# Altium footprint library Footprints.PcbLib: 67 footprints (part 4 of 5)
Each footprint in its own frame and in the unit in brackets; x right, y up, seen from the top. Pads: shape width x height; smd on the part's side, far side on the other; paste and mask are expansions set on the pad; w line width, h text height; cw(c..) or ccw(c..) is an arc to the next point about the centre after c.
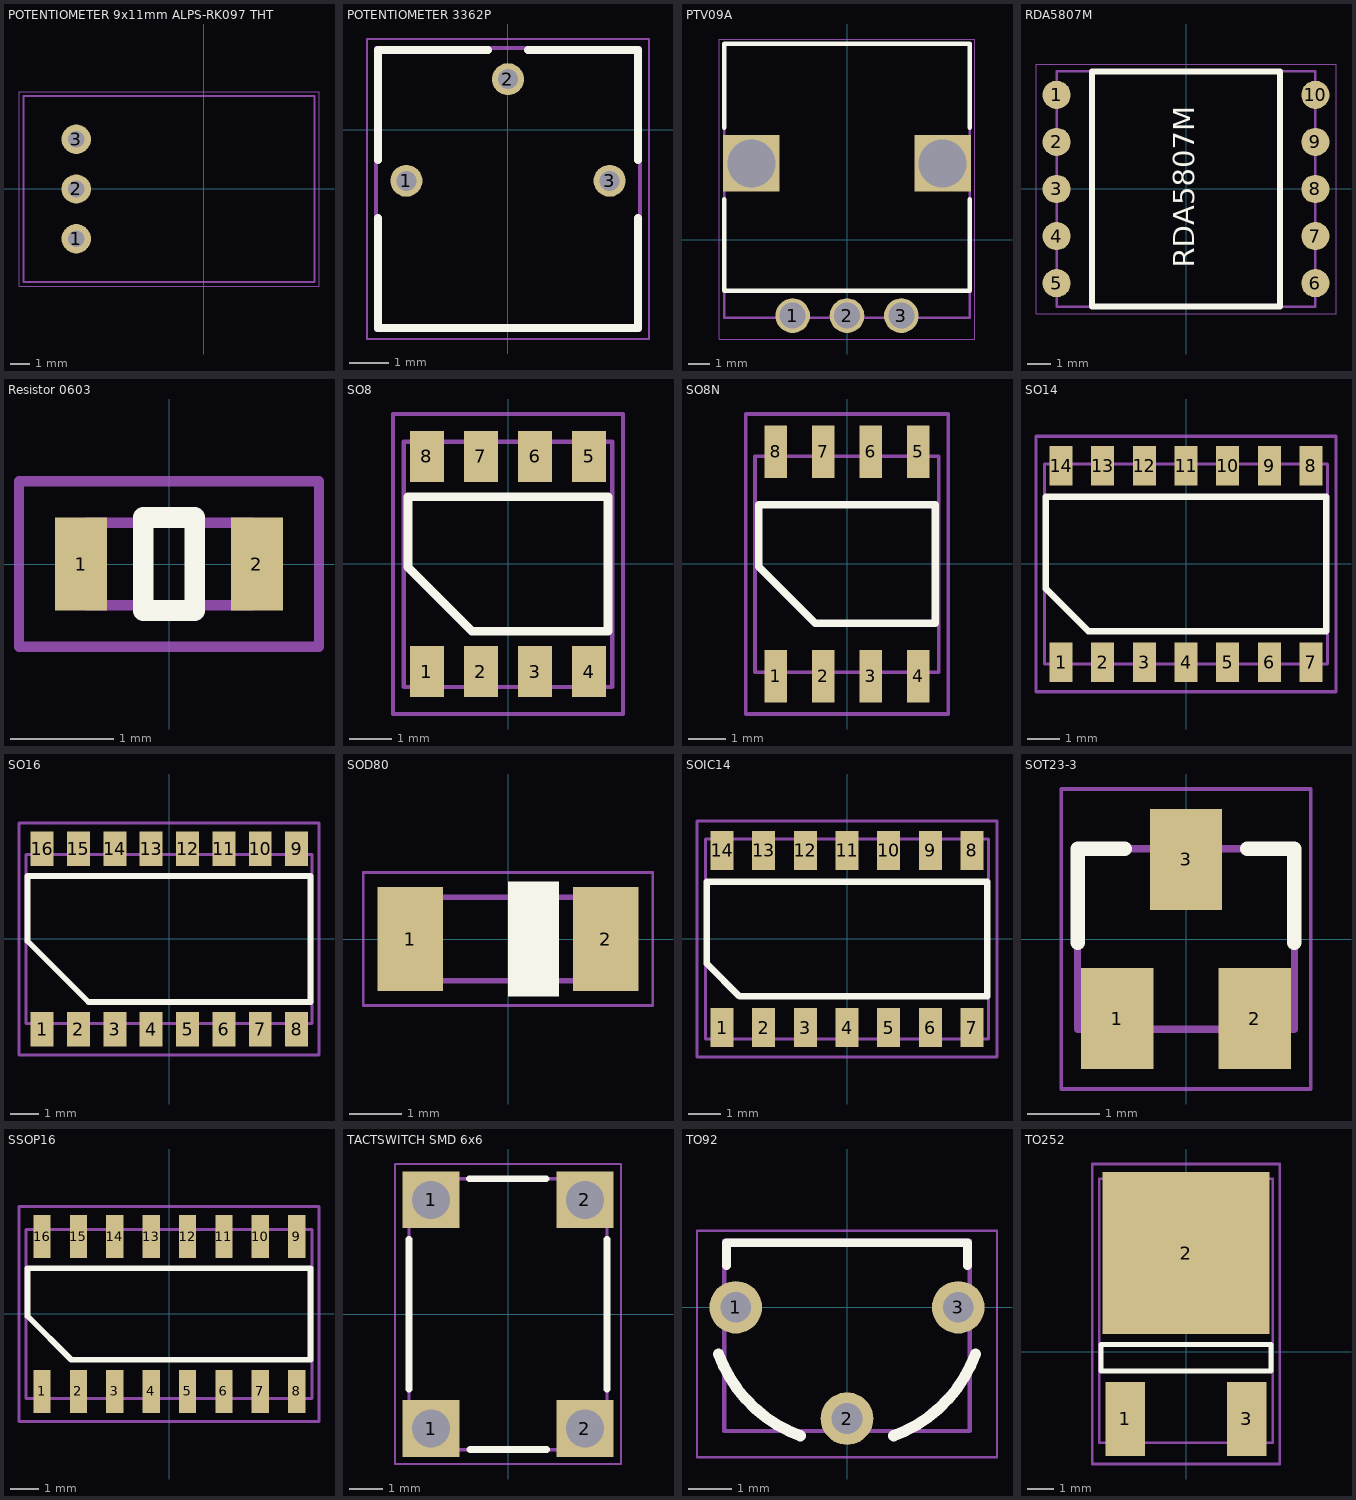
[diagram p3: the footprints below, top view; thin cyan lines are the x and y axes]

## POTENTIOMETER 9x11mm ALPS-RK097 THT [mm]
pads (3):
  round 1.5 hole 0.85: 1(-6.5,-2.54) 2(-6.5,0) 3(-6.5,2.54)
Placement:
  lines w0.1: -9.2,-4.75 5.675,-4.75 5.675,4.75 -9.2,4.75 -9.2,-4.75
  text "'.Designator'" at -8.125,-0.875 h2.4
Keep-Out:
  lines w0.05: -9.425,-4.975 -9.425,4.975 5.9,4.975 5.9,-4.975 -9.425,-4.975
3D body "pot.step": height 46.92, standoff 19.87, extent -9.207,-4.745 5.669,4.755

## POTENTIOMETER 3362P [mm]
pads (3):
  round 0.8 hole 0.5: 1(-2.54,-1.27) 2(0,1.27) 3(2.54,-1.27)
Top Overlay:
  lines w0.2: -3.25,-2.2 -3.25,-4.95 3.25,-4.95 3.25,-2.2 ; -3.25,-0.75 -3.25,2 -0.5,2 ; 0.5,2 3.25,2 3.25,-0.75
Placement:
  lines w0.1: -3.3,-5 -3.3,2.05 3.3,2.05 3.3,-5 -3.3,-5
  text "'.Designator'" at -2.5,-2 h1.8
Keep-Out:
  lines w0.05: -3.525,-5.225 3.525,-5.225 3.525,2.275 -3.525,2.275 -3.525,-5.225
3D body "User Library-Bourns 3362P.step": height 4.7, standoff -5.47, extent -3.3,-5.004 3.3,2.05

## PTV09A [mm]
pads (5):
  round 1.6 hole 1.2: 1(-2.5,-3.5) 2(0,-3.5) 3(2.5,-3.5)
  rect 2.6x2.6 hole 2.2 square: ""(-4.4,3.5) ""(4.4,3.5)
Top Overlay:
  lines w0.2: -5.65,1.85 -5.65,-2.35 5.65,-2.35 5.65,1.85 ; -5.65,5.15 -5.65,9 5.65,9 5.65,5.15
Placement:
  lines w0.1: -5.65,-3.6 5.65,-3.6 5.65,9 -5.65,9 -5.65,-3.6
  text "'.Designator'" at -4.5,6.35 h1.2
Keep-Out:
  lines w0.05: -5.875,-4.575 -5.875,9.225 5.875,9.225 5.875,-4.575 -5.875,-4.575
3D body "User Library-PTV09A-4.STEP": height 32.14, standoff -3.13, extent -5.65,-3.6 5.65,9

## RDA5807M [mm]
pads (10):
  round 1.2 smd: 1(-5.5,4) 2(-5.5,2) 3(-5.5,0) 4(-5.5,-2) 5(-5.5,-4) 6(5.5,-4) 7(5.5,-2) 8(5.5,0) 9(5.5,2) 10(5.5,4)
Top Overlay:
  lines w0.254: -4,-5 -4,5 4,5 4,-5 -4,-5
  text "RDA5807M" at 0.35,-3.35 h0.9
Placement:
  lines w0.1: -5.5,-5 5.5,-5 5.5,5 -5.5,5 -5.5,-5
  text "'.Designator'" at -3.2,-0.55 h1.2
Keep-Out:
  lines w0.05: -6.375,-5.3 6.375,-5.3 6.375,5.3 -6.375,5.3 -6.375,-5.3
3D body: height 1, standoff 0, extent -5.5,-5 5.5,5
3D body: height 2, standoff 1, extent -2,0 2,4
3D body: height 2, standoff 1, extent -3.5,-3 3,-2

## Resistor 0603 [mm]
pads (2):
  rect 0.5x0.9 smd: 1(-0.85,0) 2(0.85,0)
Top Overlay:
  lines w0.2: -0.25,-0.45 0.25,-0.45 0.25,0.45 -0.25,0.45 -0.25,-0.45
Placement:
  lines w0.1: -0.8,-0.4 -0.8,0.4 0.8,0.4 0.8,-0.4 -0.8,-0.4
  text "'.Designator'" at -0.225,-0.025 h0.3
Keep-Out:
  lines w0.1: -1.45,-0.8 1.45,-0.8 1.45,0.8 -0.675,0.8 -1.45,0.8 -1.45,-0.8
3D body "User Library-SMD RESISTOR-1.step": height 0.43, standoff -0.03, extent -0.8,-0.4 0.8,0.4

## SO8 [mm]
pads (8):
  rect 0.8x1.2 smd: 1(-1.905,-2.53) 2(-0.635,-2.53) 3(0.635,-2.53) 4(1.905,-2.53) 5(1.905,2.53) 6(0.635,2.53) 7(-0.635,2.53) 8(-1.905,2.53)
Top Overlay:
  lines w0.2: -2.35,-0.075 -0.85,-1.575 2.35,-1.575 2.35,1.575 -2.35,1.575 -2.35,-0.075
Placement:
  lines w0.1: -2.452,-2.89 -2.452,2.874 2.449,2.874 2.449,-2.89 -2.452,-2.89
  text "'.Designator'" at -1.8,0.6 h1.2
Keep-Out:
  lines w0.1: -2.7,-3.525 -2.7,3.525 2.7,3.525 2.7,-3.525 -2.7,-3.525
3D body "CircuitWorks-SO-8.step": height 1.45, standoff 0, extent -2.452,-2.889 2.45,2.889

## SO8N [mm]
pads (8):
  rect 0.6x1.4 smd: 1(-1.905,-3) 2(-0.635,-3) 3(0.635,-3) 4(1.905,-3) 5(1.905,3) 6(0.635,3) 7(-0.635,3) 8(-1.905,3)
Top Overlay:
  lines w0.2: -2.35,-0.075 -0.85,-1.575 2.35,-1.575 2.35,1.575 -2.35,1.575 -2.35,-0.075
Placement:
  lines w0.1: -2.452,-2.89 -2.452,2.874 2.449,2.874 2.449,-2.89 -2.452,-2.89
  text "'.Designator'" at -1.8,0.6 h1.2
Keep-Out:
  lines w0.1: -2.7,-4 -2.7,4 2.7,4 2.7,-4 -2.7,-4
3D body "CircuitWorks-SO-8.step": height 1.45, standoff 0, extent -2.452,-2.889 2.45,2.889

## SO14 [mm]
pads (14):
  rect 0.7x1.2 smd: 1(-3.81,-3) 2(-2.54,-3) 3(-1.27,-3) 4(0,-3) 5(1.27,-3) 6(2.54,-3) 7(3.81,-3) 8(3.81,3) 9(2.54,3) 10(1.27,3) 11(0,3) 12(-1.27,3) 13(-2.54,3) 14(-3.81,3)
Top Overlay:
  lines w0.2: -4.275,-0.75 -4.275,2.05 4.275,2.05 4.275,-2.05 -2.975,-2.05 -4.275,-0.75
Placement:
  lines w0.1: -4.318,-3.048 4.318,-3.048 4.318,3.048 -4.318,3.048 -4.318,-3.048
Keep-Out:
  lines w0.1: -4.575,-3.9 4.575,-3.9 4.575,3.9 -4.575,3.9 -4.575,-3.9
3D body "CircuitWorks-SO-14.step": height 1.75, standoff 0, extent -4.318,-3.048 4.318,3.048

## SO16 [mm]
pads (16):
  rect 0.8x1.2 smd: 1(-4.445,-3.15) 2(-3.175,-3.15) 3(-1.905,-3.15) 4(-0.635,-3.15) 5(0.635,-3.15) 6(1.905,-3.15) 7(3.175,-3.15) 8(4.445,-3.15) 9(4.445,3.15) 10(3.175,3.15) 11(1.905,3.15) 12(0.635,3.15) 13(-0.635,3.15) 14(-1.905,3.15) 15(-3.175,3.15) 16(-4.445,3.15)
Top Overlay:
  lines w0.2: -4.95,-0.075 -2.825,-2.2 4.925,-2.2 4.925,2.2 -4.95,2.2 -4.95,-0.075
Placement:
  lines w0.1: -5,-2.95 -5,2.95 4.975,2.95 4.975,-2.95 -5,-2.95
  text "'.Designator'" at -3.8,0.6 h1.2
Keep-Out:
  lines w0.1: -5.25,-4.05 -5.25,4.05 5.225,4.05 5.225,-4.05 -5.25,-4.05
3D body "CircuitWorks-SO-16.step": height 1.45, standoff 0, extent -4.982,-2.953 5,2.953

## SOD80 [mm]
pads (2):
  rect 1.25x2 smd: 1(-1.875,0) 2(1.875,0)
Top Overlay:
  rectangle: 0,-1.1 0.975,1.1
Placement:
  lines w0.1: -1.825,-0.8 1.875,-0.8 1.875,0.8 -1.825,0.8 -1.825,-0.8
  text "'.Designator'" at -1.475,-0.175 h0.6
Keep-Out:
  lines w0.05: -2.775,-1.275 2.775,-1.275 2.775,1.275 -1.25,1.275 -2.775,1.275 -2.775,-1.275
3D body "User Library-MiniMelf-2.step": height 1.58, standoff -0.02, extent -1.82,-0.8 1.88,0.8

## SOIC14 [mm]
pads (14):
  rect 0.7x1.2 smd: 1(-3.81,-2.7) 2(-2.54,-2.7) 3(-1.27,-2.7) 4(0,-2.7) 5(1.27,-2.7) 6(2.54,-2.7) 7(3.81,-2.7) 8(3.81,2.7) 9(2.54,2.7) 10(1.27,2.7) 11(0,2.7) 12(-1.27,2.7) 13(-2.54,2.7) 14(-3.81,2.7)
Top Overlay:
  lines w0.2: -4.275,-0.75 -4.275,1.75 4.275,1.75 4.275,-1.75 -3.275,-1.75 -4.275,-0.75
Placement:
  lines w0.1: -4.318,-3.048 4.318,-3.048 4.318,3.048 -4.318,3.048 -4.318,-3.048
Keep-Out:
  lines w0.1: -4.575,-3.6 4.575,-3.6 4.575,3.6 -4.575,3.6 -4.575,-3.6
3D body "CircuitWorks-SO-14.step": height 1.75, standoff 0, extent -4.318,-3.048 4.318,3.048

## SOT23-3 [mm]
pads (3):
  rect 1x1.4 smd: 1(-0.95,-1.1) 2(0.95,-1.1) 3(0,1.1)
Top Overlay:
  lines w0.2: -1.5,-0.05 -1.5,1.25 -0.85,1.25 ; 0.85,1.25 1.5,1.25 1.5,-0.05
Placement:
  lines w0.1: -1.5,-1.25 -1.5,1.25 1.5,1.25 1.5,-1.25 -1.5,-1.25
  text "'.Designator'" at -1.25,-0.075 h0.3
Keep-Out:
  lines w0.05: -1.725,-2.075 1.725,-2.075 1.725,2.075 -1.725,2.075 -1.725,-2.075
3D body "User Library-SOT95P240X110-3M[SOT23-3_TO-236AB].step": height 1.09, standoff 0, extent -1.5,-1.25 1.5,1.25

## SSOP16 [mm]
pads (16):
  rect 0.6x1.5 smd: 1(-4.445,-2.7) 2(-3.175,-2.7) 3(-1.905,-2.7) 4(-0.635,-2.7) 5(0.635,-2.7) 6(1.905,-2.7) 7(3.175,-2.7) 8(4.445,-2.7) 9(4.445,2.7) 10(3.175,2.7) 11(1.905,2.7) 12(0.635,2.7) 13(-0.635,2.7) 14(-1.905,2.7) 15(-3.175,2.7) 16(-4.445,2.7)
Top Overlay:
  lines w0.2: -4.95,-0.075 -4.95,1.6 4.925,1.6 4.925,-1.6 -3.425,-1.6 -4.95,-0.075
Placement:
  lines w0.1: -5,-2.95 4.975,-2.95 4.975,2.95 -5,2.95 -5,-2.95
  text "'.Designator'" at -3.8,0.6 h1.2
Keep-Out:
  lines w0.1: -5.25,-3.75 5.225,-3.75 5.225,3.75 -5.25,3.75 -5.25,-3.75
3D body "CircuitWorks-SO-16.step": height 1.45, standoff 0, extent -4.982,-2.953 5,2.953

## TACTSWITCH SMD 6x6 [mm]
pads (4):
  rect 1.725x1.725 hole 1.15: 1(-2.33,-3.466) 1(-2.33,3.466) 2(2.33,-3.466) 2(2.33,3.466)
Top Overlay:
  lines w0.2: -3,-2.275 -3,2.275 ; -1.175,4.1 1.15,4.1 ; -1.15,-4.1 1.175,-4.1 ; 3,-2.275 3,2.275
Placement:
  lines w0.1: -3,-4.106 -3,4.106 3,4.106 3,-4.106 -3,-4.106
  text "'.Designator'" at 0,0 h0.76
Keep-Out:
  lines w0.05: -3.425,-4.541 3.425,-4.541 3.425,4.55 -3.425,4.55 -3.425,-4.541
3D body "Mechanical tactswitch THT.step": height 9.5, standoff -3.5, extent -3,-4.106 3,4.106

## TO92 [mm]
pads (3):
  round 1.2 hole 0.7: 1(-2.54,0) 2(0,-2.54) 3(2.54,0)
Top Overlay:
  lines w0.2: -2.75,0.95 -2.75,1.475 2.75,1.475 2.75,0.95
  lines w0.254: -2.932,-1.067 ccw(c0,0) -1.067,-2.932 ; 1.067,-2.932 ccw(c0,0) 2.932,-1.067
Placement:
  lines w0.1: -2.8,-2.825 -2.8,1.525 2.8,1.525 2.8,-2.825 -2.8,-2.825
  text "'.Designator'" at -3.27,-0.3 h0.9
Keep-Out:
  lines w0.05: -3.425,-3.425 3.425,-3.425 3.425,1.75 -3.425,1.75 -3.425,-3.425
3D body "User Library-TO-92D.step": height 8, standoff -3.02, extent -2.788,-2.81 2.787,1.53

## TO252 [mm]
pads (3):
  rect 1.5x2.8 smd: 1(-2.286,-2.53) 3(2.286,-2.53)
  rect 6.3x6.1 smd: 2(0,3.72)
Top Overlay:
  lines w0.2: -3.2,-0.725 3.2,-0.725 3.2,0.275 -3.2,0.275 -3.2,-0.725
Placement:
  lines w0.1: -3.27,-3.425 -3.27,6.525 3.27,6.525 3.27,-3.425 -3.27,-3.425
  text "'.Designator'" at 0.425,-2.425 h1.2
Keep-Out:
  lines w0.1: -3.525,-4.225 -3.525,7.075 3.525,7.075 3.525,-4.225 -3.525,-4.225
3D body "User Library-DPAK-1.step": height 2.24, standoff -0.17, extent -3.27,-3.411 3.27,6.528